# Altium footprint library Supernova.PcbLib: 77 footprints (part 5 of 6)
Each footprint in its own frame and in the unit in brackets; x right, y up, seen from the top. Pads: shape width x height; smd on the part's side, far side on the other; paste and mask are expansions set on the pad; w line width, h text height; cw(c..) or ccw(c..) is an arc to the next point about the centre after c.
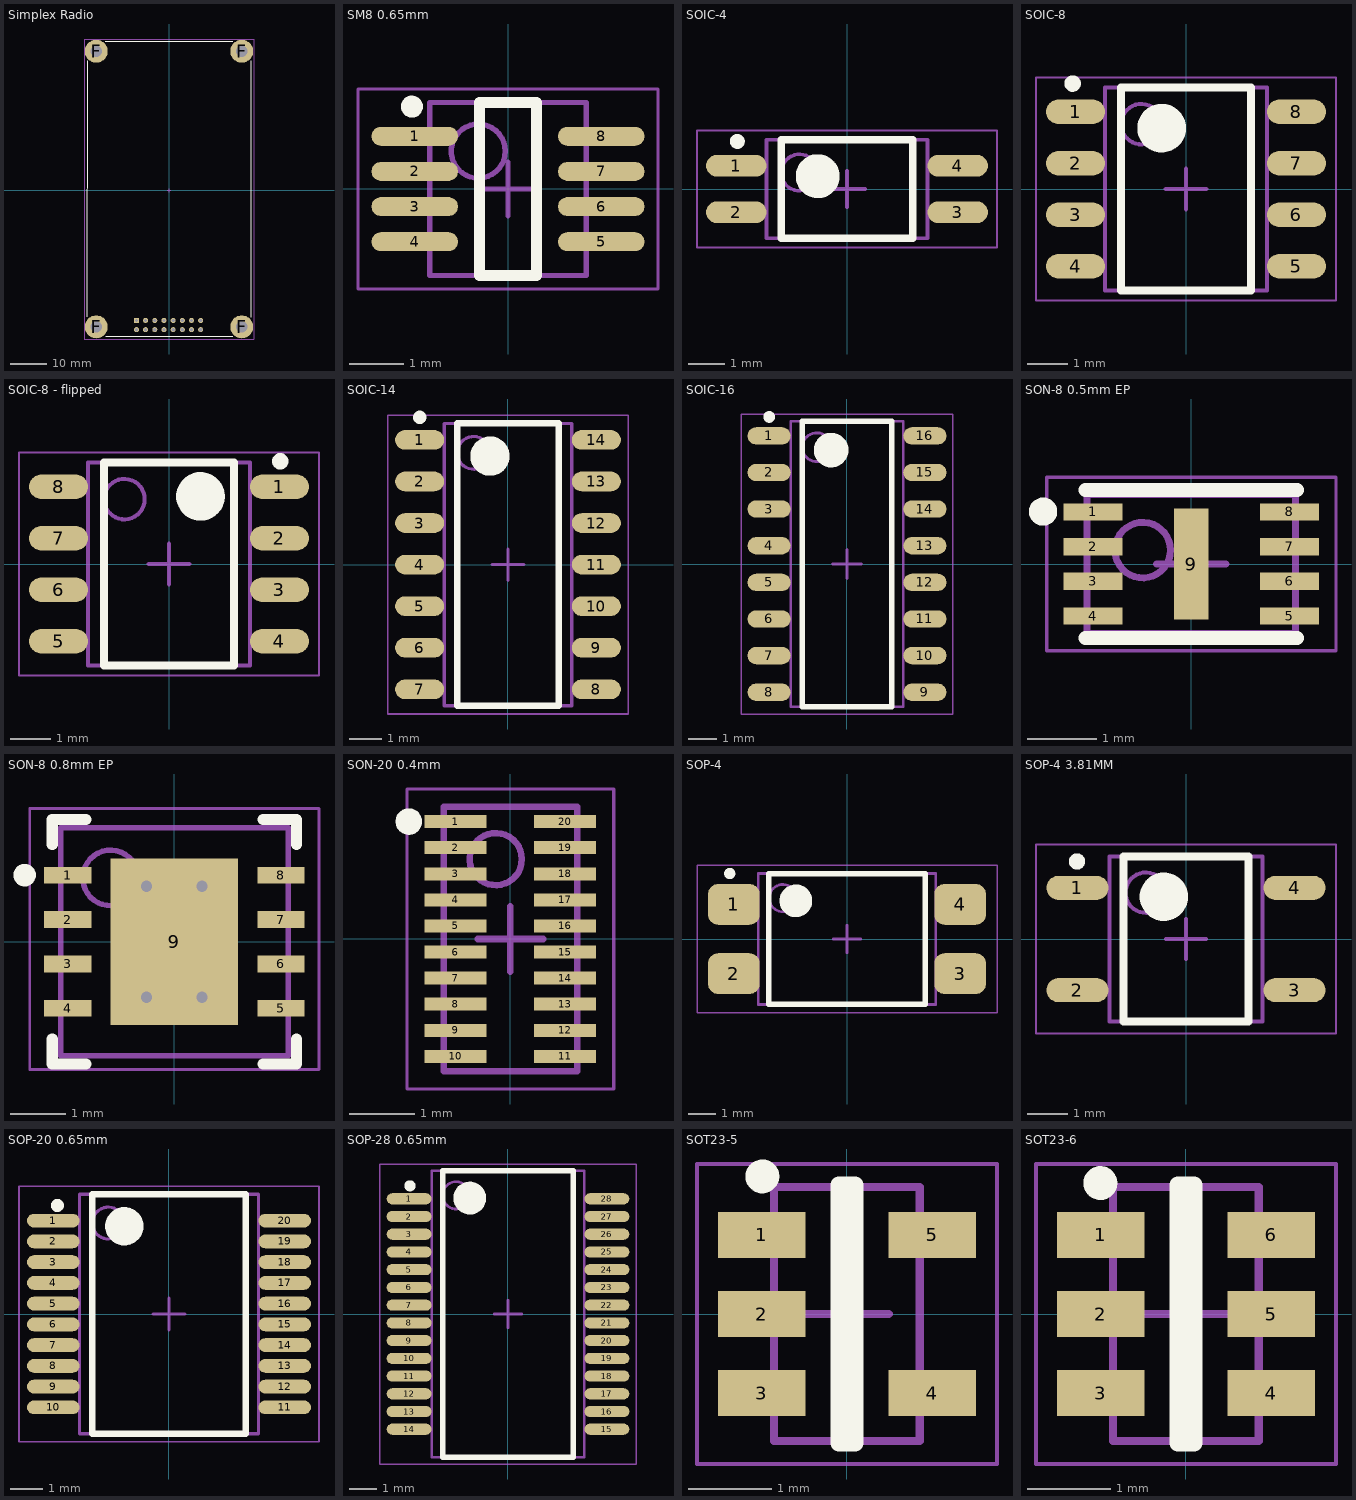
[diagram p4: the footprints below, top view; thin cyan lines are the x and y axes]

## Simplex Radio [mil]
pads (20):
  rect 55x55 hole 36: 1(-354.92,-1416.14)
  round 55 hole 36: 2(-354.92,-1516.14) 3(-254.92,-1416.14) 4(-254.92,-1516.14) 5(-154.92,-1416.14) 6(-154.92,-1516.14) 7(-54.92,-1416.14) 8(-54.92,-1516.14) 9(45.08,-1416.14) 10(45.08,-1516.14) 11(145.08,-1416.14) 12(145.08,-1516.14) 13(245.08,-1416.14) 14(245.08,-1516.14) 15(345.08,-1416.14) 16(345.08,-1516.14)
  round 250 hole 125: F(-792.32,-1485.83) F(-792.32,1516.14) F(792.32,-1485.83) F(792.32,1516.14)
Top Overlay:
  lines w10: -890.75,-1377.56 -886.81,1413.78 ; -693.9,1624.41 693.9,1624.41 ; -689.96,-1588.19 691.93,-1588.19 ; 894.69,-1381.5 894.69,1413.78
Top Courtyard:
  lines w1.97: -925.2,-1618.11 925.2,-1618.11 925.2,1649.61 -925.2,1649.61 -925.2,-1618.11
  lines w3.94: -18.9,0 18.9,0 ; 0,-18.9 0,18.9
3D body "TSW-108-06-F-D_2_14.stp": height 375, standoff 75, extent -403.92,-1566.57 396.08,-1366.57
3D body "SLW-108-01-F-D_2_14.stp": height 180, standoff -115, extent -404.92,-1563.64 395.08,-1368.64
3D body "Simplex Transmitter%2c GlobalStar.STEP": height 440, standoff -54.65, extent -890.93,-1583.15 889.07,1616.85

## SM8 0.65mm [mm] "TSOP, 8-Leads, Body 2.95x2.80mm, Pitch 0.65mm, IPC Medium Density"
height 1.3
pads (8):
  oval 1.6x0.35 smd mask+0.013: 1(-1.725,0.975) 2(-1.725,0.325) 3(-1.725,-0.325) 4(-1.725,-0.975) 5(1.725,-0.975) 6(1.725,-0.325) 7(1.725,0.325) 8(1.725,0.975)
Top Overlay:
  circle w0.203: c-1.778,1.524 r0.102
  lines w0.2: -0.525,-1.6 -0.525,1.6 0.525,1.6 0.525,-1.6 -0.525,-1.6
Top 3D Body:
  circle w0.1: c-0.55,0.7 r0.5
  lines w0.1: -1.45,-1.6 -1.45,1.6 1.45,1.6 1.45,-1.6 -1.45,-1.6
Top Courtyard:
  lines w0.05: -2.775,-1.85 -2.775,1.85 2.775,1.85 2.775,-1.85 -2.775,-1.85
  lines w0.1: -0.5,0 0.5,0 ; 0,-0.5 0,0.5
3D body: height 0.2, standoff 0, extent -2.032,0.147 2.032,0.484
3D body: height 0.2, standoff 0, extent -2.032,-0.484 2.032,-0.147
3D body: height 0.2, standoff 0, extent -2.032,-1.135 2.032,-0.797
3D body: height 0.2, standoff 0, extent -2.032,0.797 2.032,1.134
3D body: height 1.3, standoff 0, extent -1.45,-1.6 1.45,1.6

## SOIC-4 [mm] "SOP, 4-Leads, Body 2.50x4.40mm, Pitch 1.27mm, IPC Medium Density"
height 2.39
pads (4):
  oval 1.65x0.6 smd: 1(-3.025,0.635) 2(-3.025,-0.635) 3(3.025,-0.635) 4(3.025,0.635)
Top Overlay:
  circle w0.6: c-0.8,0.35 r0.3
  circle w0.203: c-2.997,1.3 r0.102
  lines w0.2: -1.8,-1.35 -1.8,1.35 1.8,1.35 1.8,-1.35 -1.8,-1.35
Top 3D Body:
  circle w0.1: c-1.3,0.45 r0.5
  lines w0.1: -2.2,-1.35 -2.2,1.35 2.2,1.35 2.2,-1.35 -2.2,-1.35
Top Courtyard:
  lines w0.05: -4.1,-1.6 -4.1,1.6 4.1,1.6 4.1,-1.6 -4.1,-1.6
  lines w0.1: -0.5,0 0.5,0 ; 0,-0.5 0,0.5
3D body: height 0.4, standoff 0, extent -3.375,-0.845 3.4,-0.42
3D body: height 0.4, standoff 0, extent -3.375,0.425 3.4,0.85
3D body: height 2.39, standoff 0, extent -2.2,-1.35 2.2,1.35

## SOIC-8 [mm] "SOIC, 8-Leads, Body 4.90x3.90mm, Pitch 1.27mm, IPC Medium Density"
height 1.75
pads (8):
  oval 1.45x0.6 smd: 1(-2.725,1.905) 2(-2.725,0.635) 3(-2.725,-0.635) 4(-2.725,-1.905) 5(2.725,-1.905) 6(2.725,-0.635) 7(2.725,0.635) 8(2.725,1.905)
Top Overlay:
  circle w0.203: c-2.797,2.6 r0.102
  circle w0.6: c-0.6,1.5 r0.3
  lines w0.2: -1.6,-2.5 -1.6,2.5 1.6,2.5 1.6,-2.5 -1.6,-2.5
Top 3D Body:
  circle w0.1: c-1.1,1.6 r0.5
  lines w0.1: -2,-2.5 -2,2.5 2,2.5 2,-2.5 -2,-2.5
Top Courtyard:
  lines w0.05: -3.7,-2.75 -3.7,2.75 3.7,2.75 3.7,-2.75 -3.7,-2.75
  lines w0.1: -0.5,0 0.5,0 ; 0,-0.5 0,0.5
3D body "User Library-SOIC-8-1.step": height 1.75, standoff 0, extent -3,-2.45 3,2.45

## SOIC-8 - flipped [mm] "SOIC, 8-Leads, Body 4.90x3.90mm, Pitch 1.27mm, IPC Medium Density"
height 1.75
pads (8):
  oval 1.45x0.6 smd: 1(2.725,1.905) 2(2.725,0.635) 3(2.725,-0.635) 4(2.725,-1.905) 5(-2.725,-1.905) 6(-2.725,-0.635) 7(-2.725,0.635) 8(-2.725,1.905)
Top Overlay:
  circle w0.203: c2.744,2.534 r0.102
  circle w0.6: c0.778,1.667 r0.3
  lines w0.2: -1.6,-2.5 -1.6,2.5 1.6,2.5 1.6,-2.5 -1.6,-2.5
Top 3D Body:
  circle w0.1: c-1.1,1.6 r0.5
  lines w0.1: -2,-2.5 -2,2.5 2,2.5 2,-2.5 -2,-2.5
Top Courtyard:
  lines w0.05: -3.7,-2.75 -3.7,2.75 3.7,2.75 3.7,-2.75 -3.7,-2.75
  lines w0.1: -0.5,0 0.5,0 ; 0,-0.5 0,0.5

## SOIC-14 [mm] "SOIC, 14-Leads, Body 9.90x3.90mm, Pitch 1.27mm, IPC Medium Density"
height 1.75
pads (14):
  oval 1.5x0.6 smd: 1(-2.7,3.81) 2(-2.7,2.54) 3(-2.7,1.27) 4(-2.7,0) 5(-2.7,-1.27) 6(-2.7,-2.54) 7(-2.7,-3.81) 8(2.7,-3.81) 9(2.7,-2.54) 10(2.7,-1.27) 11(2.7,0) 12(2.7,1.27) 13(2.7,2.54) 14(2.7,3.81)
Top Overlay:
  circle w0.203: c-2.697,4.5 r0.102
  circle w0.6: c-0.55,3.315 r0.3
  lines w0.2: -1.55,-4.315 1.55,-4.315 ; -1.55,-4.285 -1.55,4.315 1.55,4.315 1.55,-4.31
Top 3D Body:
  circle w0.1: c-1.05,3.415 r0.5
  lines w0.1: -1.95,-4.315 1.95,-4.315 ; -1.95,-4.31 -1.95,4.315 1.95,4.315 1.95,-4.31
Top Courtyard:
  lines w0.05: -3.675,-4.565 3.675,-4.565 ; -3.675,-4.56 -3.675,4.565 3.675,4.565 3.675,-4.56
  lines w0.1: -0.48,0 0.48,0 ; 0,-0.48 0,0.48
3D body: height 1.75, standoff 0.1, extent -1.95,-4.31 1.95,4.315
3D body: height 0.5, standoff 0, extent -3.048,3.635 3.048,3.985
3D body: height 0.5, standoff 0, extent -3.048,2.365 3.048,2.715
3D body: height 0.5, standoff 0, extent -3.048,1.095 3.048,1.445
3D body: height 0.5, standoff 0, extent -3.048,-0.175 3.048,0.175
3D body: height 0.5, standoff 0, extent -3.048,-1.445 3.048,-1.095
3D body: height 0.5, standoff 0, extent -3.048,-2.715 3.048,-2.365
3D body: height 0.5, standoff 0, extent -3.048,-3.985 3.048,-3.635

## SOIC-16 [mm] "SOIC, 16-Leads, Body 9.90x3.90mm, Pitch 1.27mm, IPC Medium Density"
height 1.75
pads (16):
  oval 1.5x0.6 smd: 1(-2.7,4.445) 2(-2.7,3.175) 3(-2.7,1.905) 4(-2.7,0.635) 5(-2.7,-0.635) 6(-2.7,-1.905) 7(-2.7,-3.175) 8(-2.7,-4.445) 9(2.7,-4.445) 10(2.7,-3.175) 11(2.7,-1.905) 12(2.7,-0.635) 13(2.7,0.635) 14(2.7,1.905) 15(2.7,3.175) 16(2.7,4.445)
Top Overlay:
  circle w0.6: c-0.55,3.95 r0.3
  circle w0.203: c-2.697,5.1 r0.102
  lines w0.2: -1.55,-4.95 1.55,-4.95 1.55,4.95 -1.55,4.95 -1.55,-4.95
Top 3D Body:
  circle w0.1: c-1.05,4.05 r0.5
  lines w0.1: -1.95,-4.95 1.95,-4.95 1.95,4.95 -1.95,4.95 -1.95,-4.95
Top Courtyard:
  lines w0.05: -3.675,-5.2 3.675,-5.2 3.675,5.2 -3.675,5.2 -3.675,-5.2
  lines w0.1: -0.5,0 0.5,0 ; 0,-0.5 0,0.5
3D body: height 1.75, standoff 0.1, extent -1.95,-4.95 1.95,4.95
3D body: height 0.5, standoff 0, extent -3.048,4.27 3.048,4.62
3D body: height 0.5, standoff 0, extent -3.048,3 3.048,3.35
3D body: height 0.5, standoff 0, extent -3.048,1.73 3.048,2.08
3D body: height 0.5, standoff 0, extent -3.048,0.46 3.048,0.81
3D body: height 0.5, standoff 0, extent -3.048,-0.81 3.048,-0.46
3D body: height 0.5, standoff 0, extent -3.048,-2.08 3.048,-1.73
3D body: height 0.5, standoff 0, extent -3.048,-3.35 3.048,-3
3D body: height 0.5, standoff 0, extent -3.048,-4.62 3.048,-4.27

## SON-8 0.5mm EP [mm] "SON, 8-Leads, Body 2.00x3.00mm, Pitch 0.50mm, Thermal Pad 1.60x0.20mm, IPC Medium Density"
height 0.6
pads (9):
  rect 0.85x0.25 smd mask+0.051: 1(-1.415,0.75) 2(-1.415,0.25) 3(-1.415,-0.25) 4(-1.415,-0.75) 5(1.415,-0.75) 6(1.415,-0.25) 7(1.415,0.25) 8(1.415,0.75)
  rect 0.5x1.6 smd paste-0.075: 9(0,0)
Top Overlay:
  circle w0.203: c-2.136,0.754 r0.102
  lines w0.2: -1.524,-1.067 1.524,-1.067 ; -1.524,1.067 1.524,1.067
Top 3D Body:
  circle w0.1: c-0.7,0.2 r0.4
  lines w0.1: -1.5,-1 1.5,-1 1.5,1 -1.5,1 -1.5,-1
Top Courtyard:
  lines w0.05: -2.085,-1.25 2.085,-1.25 2.085,1.25 -2.085,1.25 -2.085,-1.25
  lines w0.1: -0.5,0 0.5,0 ; 0,-0.5 0,0.5
3D body: height 0.6, standoff 0, extent -1.5,-1 1.5,1

## SON-8 0.8mm EP [mm] "SON, 8-Leads, Body 4.00x4.00mm, Pitch 0.80mm, Thermal Pad 3.00x2.30mm, IPC Medium Density"
height 0.6
pads (9):
  rect 0.85x0.3 smd: 1(-1.92,1.2) 2(-1.92,0.4) 3(-1.92,-0.4) 4(-1.92,-1.2) 5(1.92,-1.2) 6(1.92,-0.4) 7(1.92,0.4) 8(1.92,1.2)
  rect 2.3x3 smd paste-1.15 mask+0.025: 9(0,0)
via -0.5,1 diameter 0.5 hole 0.2
via 0.5,1 diameter 0.5 hole 0.2
via -0.5,-1 diameter 0.5 hole 0.2
via 0.5,-1 diameter 0.5 hole 0.2
Top Overlay:
  circle w0.203: c-2.697,1.2 r0.102
  lines w0.2: -2.2,-1.75 -2.2,-2.2 -1.595,-2.2 ; -2.2,1.75 -2.2,2.2 -1.595,2.2 ; 1.595,-2.2 2.2,-2.2 2.2,-1.75 ; 1.595,2.2 2.2,2.2 2.2,1.75
Top Paste:
  rectangle: -1.05,0.1 -0.1,1.4
  rectangle: -1.05,-1.4 -0.1,-0.1
  rectangle: 0.1,0.1 1.05,1.4
  rectangle: 0.1,-1.4 1.05,-0.1
Top 3D Body:
  circle w0.1: c-1.15,1.15 r0.5
  lines w0.1: -2.05,-2.05 -2.05,2.05 2.05,2.05 2.05,-2.05 -2.05,-2.05
Top Courtyard:
  lines w0.05: -2.605,-2.3 -2.605,2.4 2.605,2.4 2.605,-2.3 -2.605,-2.3
  lines w0.1: -0.5,0 0.5,0 ; 0,-0.5 0,0.5
3D body: height 0.6, standoff 0, extent -2.05,-2.05 2.05,2.05

## SON-20 0.4mm [mm] "SON, 20-Leads, Body 4.00x2.00mm, Pitch 0.40mm, IPC Medium Density"
height 0.55
pads (20):
  rect 0.95x0.2 smd mask+0: 1(-0.84,1.8) 2(-0.84,1.4) 3(-0.84,1) 4(-0.84,0.6) 5(-0.84,0.2) 6(-0.84,-0.2) 7(-0.84,-0.6) 8(-0.84,-1) 9(-0.84,-1.4) 10(-0.84,-1.8) 11(0.84,-1.8) 12(0.84,-1.4) 13(0.84,-1) 14(0.84,-0.6) 15(0.84,-0.2) 16(0.84,0.2) 17(0.84,0.6) 18(0.84,1) 19(0.84,1.4) 20(0.84,1.8)
Top Overlay:
  circle w0.203: c-1.558,1.801 r0.102
Top 3D Body:
  circle w0.1: c-0.225,1.225 r0.4
  lines w0.1: -1.025,-2.025 1.025,-2.025 1.025,2.025 -1.025,2.025 -1.025,-2.025
Top Courtyard:
  lines w0.05: -1.585,-2.3 1.585,-2.3 1.585,2.3 -1.585,2.3 -1.585,-2.3
  lines w0.1: -0.5,0 0.5,0 ; 0,-0.5 0,0.5
3D body: height 0.55, standoff 0.05, extent -1.025,-2.025 1.025,2.025

## SOP-4 [mm] "SOP, 4-Leads, Body 4.78x6.40mm, Pitch 2.54mm, IPC Medium Density"
height 2.7
pads (4):
  rrect50% 1.9x1.5 smd paste-0.1: 1(-4.15,1.27) 2(-4.15,-1.27) 3(4.15,-1.27) 4(4.15,1.27)
Top Overlay:
  circle w0.203: c-4.3,2.4 r0.102
  circle w0.6: c-1.875,1.4 r0.3
  lines w0.2: -2.875,-2.4 2.875,-2.4 2.875,2.4 -2.875,2.4 -2.875,-2.4
Top 3D Body:
  circle w0.1: c-2.35,1.5 r0.5
  lines w0.1: -3.25,-2.4 3.25,-2.4 3.25,2.4 -3.25,2.4 -3.25,-2.4
Top Courtyard:
  lines w0.05: -5.5,-2.7 5.5,-2.7 5.5,2.7 -5.5,2.7 -5.5,-2.7
  lines w0.1: -0.5,0 0.5,0 ; 0,-0.5 0,0.5
3D body: height 0.4, standoff 0, extent -4.5,-1.7 4.5,-0.825
3D body: height 0.4, standoff 0, extent -4.5,0.825 4.5,1.7
3D body: height 2.7, standoff 0, extent -3.25,-2.4 3.25,2.4

## SOP-4 3.81MM [mm] "SOP, 4-Leads, Body 4.09x3.81mm, Pitch 2.54mm, IPC Medium Density"
height 2.06
pads (4):
  oval 1.54x0.6 smd: 1(-2.695,1.27) 2(-2.695,-1.27) 3(2.695,-1.27) 4(2.695,1.27)
Top Overlay:
  circle w0.203: c-2.706,1.926 r0.102
  circle w0.6: c-0.55,1.05 r0.3
  lines w0.2: -1.55,-2.05 -1.55,2.05 1.55,2.05 1.55,-2.05 -1.55,-2.05
Top 3D Body:
  circle w0.1: c-1,1.15 r0.5
  lines w0.1: -1.9,-2.05 -1.9,2.05 1.9,2.05 1.9,-2.05 -1.9,-2.05
Top Courtyard:
  lines w0.05: -3.725,-2.35 -3.725,2.35 3.725,2.35 3.725,-2.35 -3.725,-2.35
  lines w0.1: -0.5,0 0.5,0 ; 0,-0.5 0,0.5
3D body: height 2.06, standoff 0.02, extent -1.9,-2.05 1.9,2.05
3D body: height 0.4, standoff 0, extent -3.048,1.05 3.048,1.524
3D body: height 0.4, standoff 0, extent -3.048,-1.49 3.048,-1.016

## SOP-20 0.65mm [mm] "SOP, 20-Leads, Body 7.20x5.30mm, Pitch 0.65mm, IPC Medium Density"
height 2
pads (20):
  oval 1.65x0.432 smd mask+0.025: 1(-3.625,2.925) 2(-3.625,2.275) 3(-3.625,1.625) 4(-3.625,0.975) 5(-3.625,0.325) 6(-3.625,-0.325) 7(-3.625,-0.975) 8(-3.625,-1.625) 9(-3.625,-2.275) 10(-3.625,-2.925) 11(3.625,-2.925) 12(3.625,-2.275) 13(3.625,-1.625) 14(3.625,-0.975) 15(3.625,-0.325) 16(3.625,0.325) 17(3.625,0.975) 18(3.625,1.625) 19(3.625,2.275) 20(3.625,2.925)
Top Overlay:
  circle w0.6: c-1.4,2.75 r0.3
  circle w0.203: c-3.497,3.4 r0.102
  lines w0.2: -2.4,-3.75 2.4,-3.75 2.4,3.75 -2.4,3.75 -2.4,-3.75
Top 3D Body:
  circle w0.1: c-1.9,2.85 r0.5
  lines w0.1: -2.8,-3.75 2.8,-3.75 2.8,3.75 -2.8,3.75 -2.8,-3.75
Top Courtyard:
  lines w0.05: -4.7,-4 4.7,-4 4.7,4 -4.7,4 -4.7,-4
  lines w0.1: -0.5,0 0.5,0 ; 0,-0.5 0,0.5
3D body: height 0.2, standoff 0, extent -4,-3.075 4,-2.775
3D body: height 0.2, standoff 0, extent -4,-2.425 4,-2.125
3D body: height 0.2, standoff 0, extent -4,-1.775 4,-1.475
3D body: height 0.2, standoff 0, extent -4,-1.775 4,-1.475
3D body: height 0.2, standoff 0, extent -4,-1.125 4,-0.825
3D body: height 0.2, standoff 0, extent -4,-0.475 4,-0.175
3D body: height 0.2, standoff 0, extent -4,0.175 4,0.475
3D body: height 0.2, standoff 0, extent -4,0.825 4,1.125
3D body: height 0.2, standoff 0, extent -4,1.475 4,1.775
3D body: height 0.2, standoff 0, extent -4,1.475 4,1.775
3D body: height 0.2, standoff 0, extent -4,2.125 4,2.425
3D body: height 0.2, standoff 0, extent -4,2.775 4,3.075
3D body: height 2, standoff 0.05, extent -2.8,-3.75 2.8,3.75

## SOP-28 0.65mm [mm] "SOP, 28-Leads, Body 10.20x5.30mm, Pitch 0.65mm, Thermal Pad 3.50x2.80mm, IPC Medium Density"
height 2
pads (28):
  oval 1.65x0.406 smd mask+0.025: 1(-3.625,4.225) 2(-3.625,3.575) 3(-3.625,2.925) 4(-3.625,2.275) 5(-3.625,1.625) 6(-3.625,0.975) 7(-3.625,0.325) 8(-3.625,-0.325) 9(-3.625,-0.975) 10(-3.625,-1.625) 11(-3.625,-2.275) 12(-3.625,-2.925) 13(-3.625,-3.575) 14(-3.625,-4.225) 15(3.625,-4.225) 16(3.625,-3.575) 17(3.625,-2.925) 18(3.625,-2.275) 19(3.625,-1.625) 20(3.625,-0.975) 21(3.625,-0.325) 22(3.625,0.325) 23(3.625,0.975) 24(3.625,1.625) 25(3.625,2.275) 26(3.625,2.925) 27(3.625,3.575) 28(3.625,4.225)
Top Overlay:
  circle w0.203: c-3.597,4.7 r0.102
  circle w0.6: c-1.4,4.25 r0.3
  lines w0.2: -2.4,-5.25 2.4,-5.25 2.4,5.25 -2.4,5.25 -2.4,-5.25
Top 3D Body:
  circle w0.1: c-1.9,4.35 r0.5
  lines w0.1: -2.8,-5.25 2.8,-5.25 2.8,5.25 -2.8,5.25 -2.8,-5.25
Top Courtyard:
  lines w0.05: -4.7,-5.5 4.7,-5.5 4.7,5.5 -4.7,5.5 -4.7,-5.5
  lines w0.1: -0.5,0 0.5,0 ; 0,-0.5 0,0.5
3D body: height 2, standoff 0.05, extent -2.8,-5.25 2.8,5.25
3D body: height 0.3, standoff 0, extent -3.937,-4.339 3.937,-4.111
3D body: height 0.3, standoff 0, extent -3.937,-3.689 3.937,-3.461
3D body: height 0.3, standoff 0, extent -3.937,-3.039 3.937,-2.811
3D body: height 0.3, standoff 0, extent -3.937,-2.389 3.937,-2.161
3D body: height 0.3, standoff 0, extent -3.937,-1.739 3.937,-1.511
3D body: height 0.3, standoff 0, extent -3.937,-1.089 3.937,-0.861
3D body: height 0.3, standoff 0, extent -3.937,-0.439 3.937,-0.211
3D body: height 0.3, standoff 0, extent -3.937,0.211 3.937,0.439
3D body: height 0.3, standoff 0, extent -3.937,0.861 3.937,1.089
3D body: height 0.3, standoff 0, extent -3.937,1.511 3.937,1.739
3D body: height 0.3, standoff 0, extent -3.937,2.161 3.937,2.389
3D body: height 0.3, standoff 0, extent -3.937,2.811 3.937,3.039
3D body: height 0.3, standoff 0, extent -3.937,3.461 3.937,3.689
3D body: height 0.3, standoff 0, extent -3.937,4.111 3.937,4.339

## SOT23-5 [mm] "SOT23, 5-Leads, Body 2.90x2.45mm, Pitch 0.95mm, IPC Medium Density"
height 1.45
pads (5):
  rect 1.05x0.55 smd: 1(-1.025,0.95) 2(-1.025,0) 3(-1.025,-0.95) 4(1.025,-0.95) 5(1.025,0.95)
Top Overlay:
  circle w0.203: c-1.016,1.651 r0.102
  lines w0.2: -0.1,-1.55 -0.1,1.55 0.1,1.55 0.1,-1.55 -0.1,-1.55
Top 3D Body:
  lines w0.1: -0.875,-1.525 0.875,-1.525 0.875,1.525 -0.875,1.525 -0.875,-1.525
Top Courtyard:
  lines w0.05: -1.8,-1.8 1.8,-1.8 1.8,1.8 -1.8,1.8 -1.8,-1.8
  lines w0.1: -0.5,0 0.5,0 ; 0,-0.5 0,0.5
3D body "CircuitWorks-SOT-23-5.step": height 1.1, standoff 0, extent -1.25,-1.5 1.25,1.5

## SOT23-6 [mm] "SOT23, 6-Leads, Body 2.90x2.45mm, Pitch 0.95mm, IPC Medium Density"
height 1.45
pads (6):
  rect 1.05x0.55 smd: 1(-1.025,0.95) 2(-1.025,0) 3(-1.025,-0.95) 4(1.025,-0.95) 5(1.025,0) 6(1.025,0.95)
Top Overlay:
  circle w0.203: c-1.028,1.571 r0.102
  lines w0.2: -0.1,-1.55 -0.1,1.55 0.1,1.55 0.1,-1.55 -0.1,-1.55
Top 3D Body:
  lines w0.1: -0.875,-1.525 0.875,-1.525 0.875,1.525 -0.875,1.525 -0.875,-1.525
Top Courtyard:
  lines w0.05: -1.8,-1.8 1.8,-1.8 1.8,1.8 -1.8,1.8 -1.8,-1.8
  lines w0.1: -0.5,0 0.5,0 ; 0,-0.5 0,0.5
3D body: height 1.45, standoff 0, extent -0.875,-1.525 0.875,1.525
3D body: height 0.2, standoff 0, extent -1.3,0.75 1.3,1.15
3D body: height 0.2, standoff 0, extent -1.3,-0.2 1.3,0.2
3D body: height 0.2, standoff 0, extent -1.3,-1.15 1.3,-0.75